# Altium footprint library TarabusLib_KOR.PcbLib: 560 footprints (part 26 of 35)
Each footprint in its own frame and in the unit in brackets; x right, y up, seen from the top. Pads: shape width x height; smd on the part's side, far side on the other; paste and mask are expansions set on the pad; w line width, h text height; cw(c..) or ccw(c..) is an arc to the next point about the centre after c.
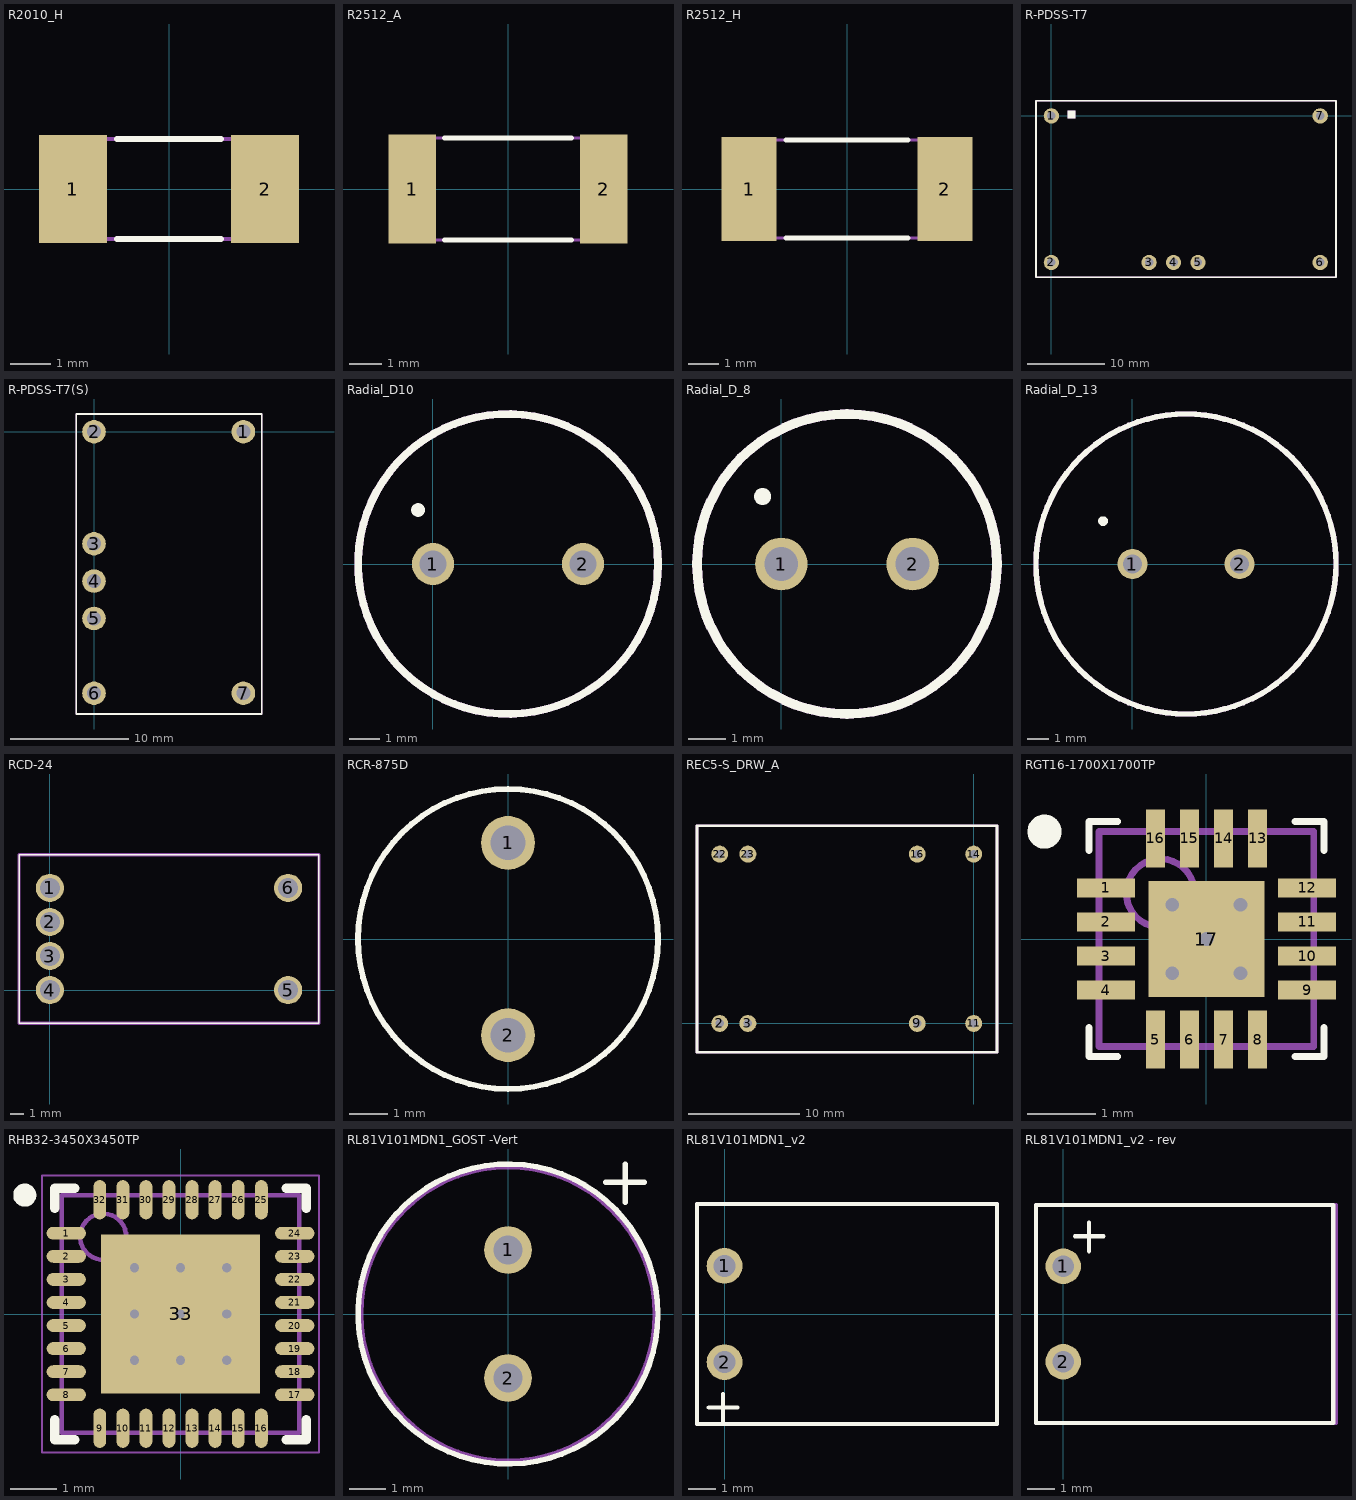
[diagram p25: the footprints below, top view; thin cyan lines are the x and y axes]

## R2010_H [mm]
height 0.55
pads (2):
  rect 1.7x2.7 smd: 1(-2.4,0) 2(2.4,0)
Top Overlay:
  lines w0.15: -1.3,-1.25 1.3,-1.25 ; -1.3,1.25 1.3,1.25
Mechanical 7:
  lines w0.1: -2.5,-1.25 2.5,-1.25 2.5,1.25 -2.5,1.25 -2.5,-1.25
Mechanical 10:
  text ".Designator" at -0.5,1.85 h0.8
  text ".Comment" at -0.48,-2.04 h0.6
3D body: height 0.55, standoff 0, extent -2.5,-1.25 2.5,1.25

## R2512_A [mm]
height 0.55
pads (2):
  rect 1.5x3.4 smd: 1(-3,0) 2(3,0)
Top Overlay:
  lines w0.15: -2,-1.6 2,-1.6 ; -2,1.6 2,1.6
Mechanical 9:
  text ".Comment" at -0.35,-1 h0.6
  text ".Designator" at -1.6,0.55 h0.8
Mechanical 11:
  lines w0.1: -3.175,-1.6 3.175,-1.6 3.175,1.6 -3.175,1.6 -3.175,-1.6
3D body: height 0.55, standoff 0, extent -3.175,-1.6 3.175,1.6

## R2512_H [mm]
height 0.55
pads (2):
  rect 1.8x3.4 smd: 1(-3.2,0) 2(3.2,0)
Top Overlay:
  lines w0.15: -2,-1.6 2,-1.6 ; -2,1.6 2,1.6
Mechanical 7:
  lines w0.1: -3.175,-1.6 3.175,-1.6 3.175,1.6 -3.175,1.6 -3.175,-1.6
Mechanical 10:
  text ".Comment" at -0.57,-2.39 h0.6
  text ".Designator" at -0.51,1.96 h0.8
3D body: height 0.55, standoff 0, extent -3.175,-1.6 3.175,1.6

## R-PDSS-T7 [mm]
pads (7):
  round 2 hole 1.1: 1(0,0) 2(0,-19.05) 3(12.7,-19.05) 4(15.88,-19.05) 5(19.06,-19.05) 6(34.94,-19.05) 7(34.94,0)
Top Overlay:
  rectangle: 2.125,-0.325 3.125,0.675
  lines w0.2: -2,-21 -2,2 37,2 37,-21 -2,-21
Mechanical 7:
  rectangle: 2.125,-0.325 3.125,0.675
  lines w0.2: -2,-21 37,-21 37,2 -2,2 -2,-21
Mechanical 10:
  text ".Comment" at 32.5,-22.4 h0.6
  text ".Designator" at 33.23,3.24 h0.8
3D body: height 9, standoff 0, extent -2,-21 37,2

## R-PDSS-T7(S) [mm]
height 9
pads (7):
  round 2 hole 1.2: 1(12.7,0) 2(0,0) 3(0,-9.52) 4(0,-12.7) 5(0,-15.88) 6(0,-22.23) 7(12.7,-22.23)
Top Overlay:
  lines w0.15: -1.5,-24 14.25,-24 14.25,1.5 -1.5,1.5 -1.5,-24
Mechanical 7:
  lines w0.15: -1.5,-24 -1.5,1.5 14.25,1.5 14.25,-24 -1.5,-24
Mechanical 10:
  text ".Comment" at 11,2 h0.6
  text ".Designator" at 11.25,2.75 h0.8
3D body: height 9, standoff 0, extent -1.5,-24 14.25,1.5

## Radial_D10 [mm]
pads (2):
  round 1.4 hole 0.9: 1(0,0) 2(5,0)
Top Overlay:
  circle w0.254: c2.5,0 r5
  circle w0.254: c-0.5,1.8 r0.1
Mechanical 1:
  circle w0.254: c2.5,0 r5
3D body "SW3DPS-ELECTROLITIC CAPACITOR RADIAL 10X12-DEFAULT.STEP": height 12, standoff -2.5, extent -2.5,-4.9 7.5,5.1

## Radial_D_8 [mm]
pads (2):
  round 1.4 hole 0.9: 1(0,0) 2(3.5,0)
Top Overlay:
  circle w0.254: c1.75,0 r4
  circle w0.254: c-0.5,1.8 r0.1
Mechanical 1:
  circle w0.254: c1.75,0 r4
3D body "SW3DPS-ELECTROLITIC CAPACITOR RADIAL 8X12-DEFAULT.STEP": height 12, standoff -2.5, extent -2.3,-3.9 5.7,4.1

## Radial_D_13 [mm]
pads (2):
  round 1.4 hole 0.9: 1(0,0) 2(5,0)
Top Overlay:
  circle w0.254: c2.5,0 r7
  circle w0.254: c-1.37,2 r0.1
Mechanical 1:
  circle w0.254: c2.5,0 r7
3D body: height 22, standoff 0, extent -4.445,-6.986 9.5,6.986

## RCD-24 [mm]
pads (6):
  round 2.1 hole 1.5: 1(0,7.62) 2(0,5.08) 3(0,2.54) 4(0,0) 5(17.78,0) 6(17.78,7.62)
Top Overlay:
  lines w0.1: -2.3,-2.46 -2.3,10.08 20.08,10.08 20.08,-2.46 -2.3,-2.46
Mechanical 1:
  lines w0.254: -2.3,-2.46 20.08,-2.46 20.08,10.08 -2.3,10.08 -2.3,-2.46
Mechanical 7:
  lines w0.254: -2.3,-2.46 -2.3,10.08 20.08,10.08 20.08,-2.46 -2.3,-2.46
3D body: height 8, standoff 0, extent -2.3,-2.46 20.08,10.08

## RCR-875D [mm]
height 7.5
pads (2):
  round 1.4 hole 0.9: 1(0,2.5) 2(0,-2.5)
Top Overlay:
  circle w0.15: c0,0 r3.9
Mechanical 7:
  circle w0.1: c0,0 r3.9
Mechanical 10:
  text ".Comment" at -1.245,4.335 h0.6
  text ".Designator" at -1.255,4.905 h0.8
3D body: height 7.5, standoff 0, extent -3.869,-3.892 3.9,3.892

## REC5-S_DRW_A [mil]
height 401.57
pads (8):
  round 60 hole 30: 2(-900,0) 3(-800,0) 9(-200,0) 11(0,0) 14(0,600) 16(-200,600) 22(-900,600) 23(-800,600)
Top Overlay:
  lines w10: -980.32,-102.36 82.68,-102.36 82.68,-70.87 82.68,700.79 -980.32,700.79 -980.32,-102.36
Mechanical 7:
  lines w10: -980.32,-102.36 -980.32,700.79 82.68,700.79 82.68,-70.87 82.68,-102.36 -980.32,-102.36
Mechanical 10:
  text ".Comment" at -19.68,728.35 h23.62
  text ".Designator" at -59.06,767.72 h31.5
3D body: height 401.57, standoff 0, extent -980.32,-102.36 82.68,700.79

## RGT16-1700X1700TP [mm] "QFN, 16-Leads, Body 3x3mm, Pitch 0.5mm, Thermal Pad 1.7x1.7mm, TI Recommended"
height 1
pads (17):
  rect 0.85x0.28 smd paste-0.025 mask+0.07: 1(-1.475,0.75) 2(-1.475,0.25) 3(-1.475,-0.25) 4(-1.475,-0.75) 9(1.475,-0.75) 10(1.475,-0.25) 11(1.475,0.25) 12(1.475,0.75)
  rect 0.28x0.85 smd paste-0.025 mask+0.07: 5(-0.75,-1.475) 6(-0.25,-1.475) 7(0.25,-1.475) 8(0.75,-1.475) 13(0.75,1.475) 14(0.25,1.475) 15(-0.25,1.475) 16(-0.75,1.475)
  rect 1.7x1.7 smd paste-0.85 mask+0.07: 17(0,0)
via 0,0 diameter 0.5 hole 0.2
via 0.5,0.5 diameter 0.5 hole 0.2
via 0.5,-0.5 diameter 0.5 hole 0.2
via -0.5,-0.5 diameter 0.5 hole 0.2
via -0.5,0.5 diameter 0.5 hole 0.2
Top Overlay:
  circle w0.25: c-2.375,1.575 r0.125
  lines w0.1: -1.725,-1.3 -1.725,-1.725 -1.3,-1.725 ; -1.725,1.3 -1.725,1.725 -1.3,1.725 ; 1.3,-1.725 1.725,-1.725 1.725,-1.3 ; 1.3,1.725 1.725,1.725 1.725,1.3
Top Paste:
  rectangle: 0.1,0.1 0.8,0.8
  region: 0.1,-0.1 0.1,-0.8 0.8,-0.8 0.8,-0.1
  region: -0.1,-0.1 -0.8,-0.1 -0.8,-0.8 -0.1,-0.8
  region: -0.1,0.1 -0.1,0.8 -0.8,0.8 -0.8,0.1
Mechanical 7:
  lines w0.05: -1.575,-1.575 1.575,-1.575 1.575,1.575 -1.575,1.575 -1.575,-1.575
  lines w0.1: -0.5,0 0.5,0 ; 0,-0.5 0,0.5
Mechanical 9:
  circle w0.1: c-0.675,0.675 r0.5
  lines w0.1: -1.575,-1.575 1.575,-1.575 1.575,1.575 -1.575,1.575 -1.575,-1.575
Mechanical 10:
  text ".Designator" at -1.1,-2.65 h0.7
  text ".Comment" at -0.725,2.65 h0.7
3D body: height 1, standoff 0, extent -1.575,-1.575 1.575,1.575

## RHB32-3450X3450TP [mm] "QFN, 32-Leads, Body 5x5mm, Pitch 0.5mm, Thermal Pad 3.45x3.45mm, TI Recommended"
height 1
pads (33):
  oval 0.85x0.28 smd paste-0.025 mask+0.07: 1(-2.475,1.75) 2(-2.475,1.25) 3(-2.475,0.75) 4(-2.475,0.25) 5(-2.475,-0.25) 6(-2.475,-0.75) 7(-2.475,-1.25) 8(-2.475,-1.75) 17(2.475,-1.75) 18(2.475,-1.25) 19(2.475,-0.75) 20(2.475,-0.25) 21(2.475,0.25) 22(2.475,0.75) 23(2.475,1.25) 24(2.475,1.75)
  oval 0.28x0.85 smd paste-0.025 mask+0.07: 9(-1.75,-2.475) 10(-1.25,-2.475) 11(-0.75,-2.475) 12(-0.25,-2.475) 13(0.25,-2.475) 14(0.75,-2.475) 15(1.25,-2.475) 16(1.75,-2.475) 25(1.75,2.475) 26(1.25,2.475) 27(0.75,2.475) 28(0.25,2.475) 29(-0.25,2.475) 30(-0.75,2.475) 31(-1.25,2.475) 32(-1.75,2.475)
  rect 3.45x3.45 smd paste-1.725 mask+0.07: 33(0,0)
via 1,-1 diameter 0.5 hole 0.2
via 0,-1 diameter 0.5 hole 0.2
via -1,-1 diameter 0.5 hole 0.2
via 1,0 diameter 0.5 hole 0.2
via 0,0 diameter 0.5 hole 0.2
via -1,0 diameter 0.5 hole 0.2
via 1,1 diameter 0.5 hole 0.2
via 0,1 diameter 0.5 hole 0.2
via -1,1 diameter 0.5 hole 0.2
Top Overlay:
  circle w0.25: c-3.375,2.575 r0.125
  lines w0.2: -2.725,-2.29 -2.725,-2.725 -2.29,-2.725 ; -2.725,2.29 -2.725,2.725 -2.29,2.725 ; 2.29,-2.725 2.725,-2.725 2.725,-2.29 ; 2.29,2.725 2.725,2.725 2.725,2.29
Top Paste:
  region: -0.15,-0.15 -1.6,-0.15 -1.6,-1.6 -0.15,-1.6
  rectangle: 0.15,-1.6 1.6,-0.15
  rectangle: 0.15,0.15 1.6,1.6
  region: -0.15,1.6 -1.6,1.6 -1.6,0.15 -0.15,0.15
Mechanical 13:
  circle w0.1: c-1.675,1.675 r0.5
  lines w0.1: -2.575,-2.575 2.575,-2.575 2.575,2.575 -2.575,2.575 -2.575,-2.575
Mechanical 15:
  lines w0.05: -3,-3 3,-3 3,3 -3,3 -3,-3
  lines w0.1: -0.5,0 0.5,0 ; 0,-0.5 0,0.5
3D body: height 1, standoff 0, extent -2.575,-2.575 2.575,2.575

## RL81V101MDN1_GOST -Vert [mm]
pads (2):
  round 1.3 hole 0.8: 1(0,1.75) 2(0,-1.75)
Top Overlay:
  circle w0.15: c0,0 r4.1
  lines w0.15: 2.675,3.6 3.725,3.6 ; 3.2,3.05 3.2,4.1
Mechanical 9:
  text ".Comment" at -3.2,1 h0.7
  text ".Designator" at -3.15,1.8 h0.7
Mechanical 11:
  circle w0.1: c0,0 r4
3D body "RL81V.STEP": height 8, standoff -3, extent -3.994,-4 3.994,4

## RL81V101MDN1_v2 [mm]
pads (2):
  round 1.3 hole 0.8: 1(0,1.75) 2(0,-1.75)
Top Overlay:
  lines w0.15: -0.575,-3.4 0.475,-3.4 ; -0.05,-3.95 -0.05,-2.9 ; -1,-4 -1,4 9.9,4 9.9,-4 -1,-4
Mechanical 9:
  text ".Comment" at 2.6,-4.8 h0.7
  text ".Designator" at 2.6,4.3 h0.7
Mechanical 11:
  lines w0.15: -1,-4 9.9,-4 9.9,4 -1,4 -1,-4
3D body "RL81V_1.STEP": height 7.99, standoff -3, extent -0.4,-4 9.9,4

## RL81V101MDN1_v2 - rev [mm]
pads (2):
  round 1.3 hole 0.8: 1(0,1.75) 2(0,-1.75)
Top Overlay:
  lines w0.15: 0.425,2.85 1.475,2.85 ; 0.95,2.3 0.95,3.35 ; -1,-4 -1,4 9.9,4 9.9,-4 -1,-4
Mechanical 9:
  text ".Comment" at 4.175,4.425 h0.7
  text ".Designator" at 3.7,-4.9 h0.7
Mechanical 11:
  lines w0.15: -1,-4 10,-4 10,4 -1,4 -1,-4
3D body "RL81V_2.STEP": height 7.99, standoff -3, extent -0.4,-4 9.9,4